# Altium footprint library Connectors.PcbLib: 42 footprints (part 3 of 3)
Each footprint in its own frame and in the unit in brackets; x right, y up, seen from the top. Pads: shape width x height; smd on the part's side, far side on the other; paste and mask are expansions set on the pad; w line width, h text height; cw(c..) or ccw(c..) is an arc to the next point about the centre after c.
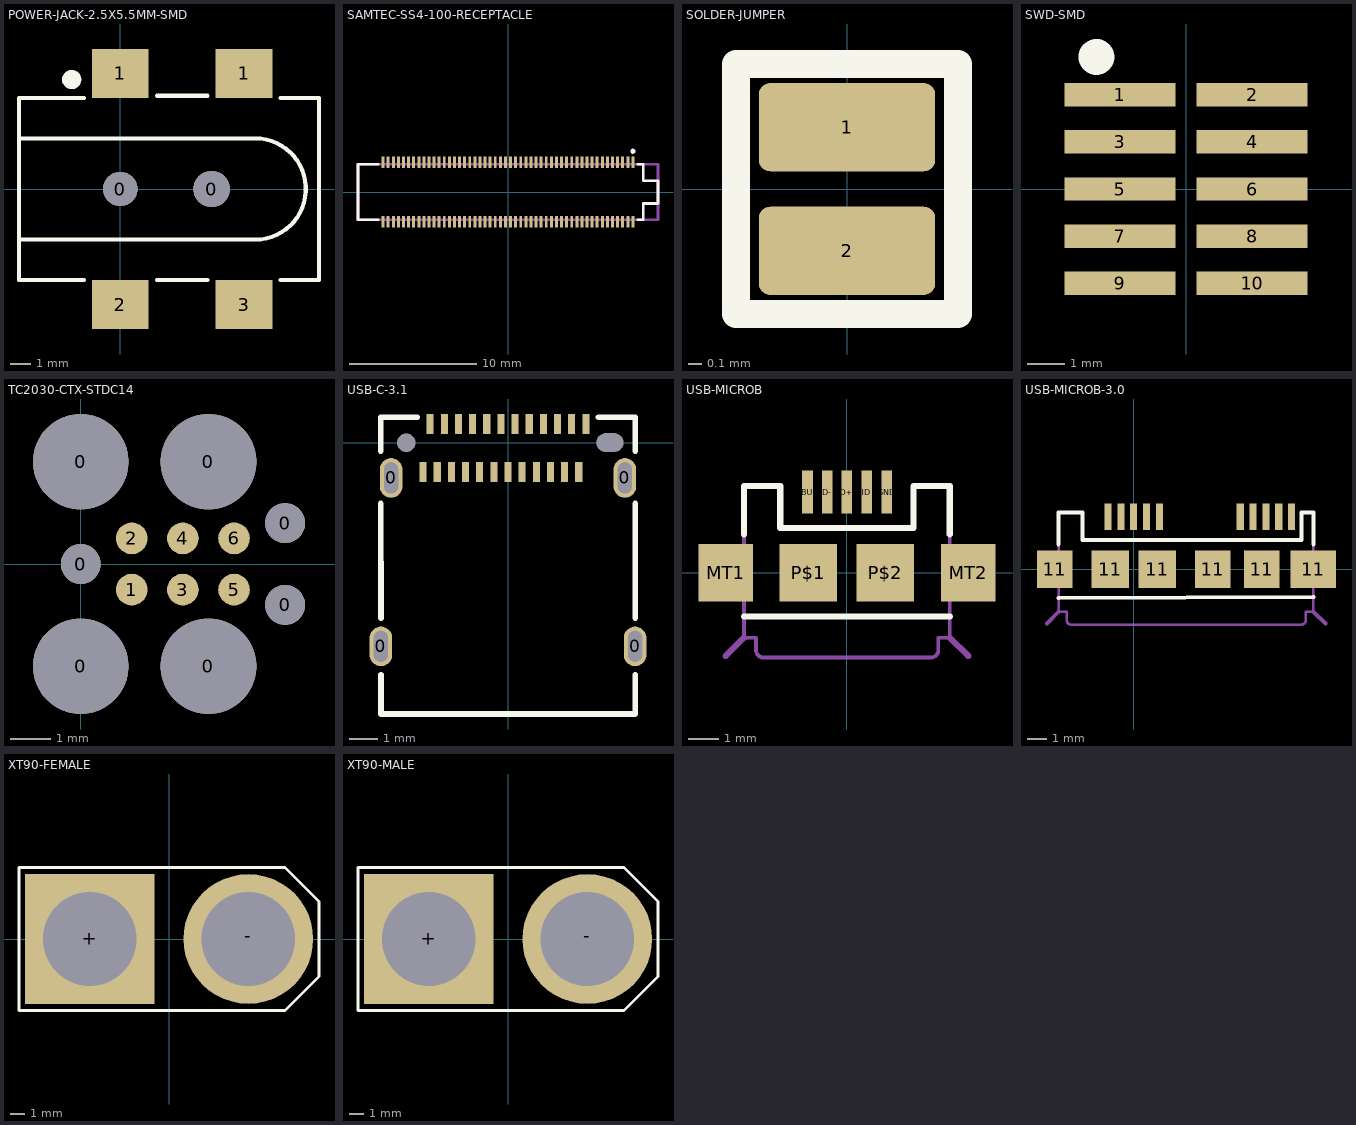
[diagram p2: the footprints below, top view; thin cyan lines are the x and y axes]

## POWER-JACK-2.5X5.5MM-SMD [mm]
pads (6):
  round 1.7 hole 1.7: 0(0,0)
  round 1.8 hole 1.8: 0(4.5,0)
  rect 2.8x2.4 smd: 1(0,5.7) 1(6.1,5.7) 2(0,-5.7) 3(6.1,-5.7)
Top Overlay:
  circle w0.5: c-2.4,5.4 r0.224
  lines w0.2: -5,-2.5 6.65,-2.5 ccw(c6.65,0) 6.65,2.5 -5,2.5 ; -1.8,-4.5 -5,-4.5 -5,4.5 -1.8,4.5 ; 1.8,-4.5 4.3,-4.5 ; 1.8,4.6 4.3,4.6 ; 7.9,-4.5 9.8,-4.5 9.8,4.5 7.9,4.5
3D body "CUI_PJ-002BH-SMT-TR.step": height 11.2, standoff -1, extent -5,-6.3 9.8,6.3

## SAMTEC-SS4-100-RECEPTACLE [mm]
pads (100):
  rect 0.23x0.93 smd: 1(9.8,2.335) 2(9.8,-2.335) 3(9.4,2.335) 4(9.4,-2.335) 5(9,2.335) 6(9,-2.335) 7(8.6,2.335) 8(8.6,-2.335) 9(8.2,2.335) 10(8.2,-2.335) 11(7.8,2.335) 12(7.8,-2.335) 13(7.4,2.335) 14(7.4,-2.335) 15(7,2.335) 16(7,-2.335) 17(6.6,2.335) 18(6.6,-2.335) 19(6.2,2.335) 20(6.2,-2.335) 21(5.8,2.335) 22(5.8,-2.335) 23(5.4,2.335) 24(5.4,-2.335) 25(5,2.335) 26(5,-2.335) 27(4.6,2.335) 28(4.6,-2.335) 29(4.2,2.335) 30(4.2,-2.335) 31(3.8,2.335) 32(3.8,-2.335) 33(3.4,2.335) 34(3.4,-2.335) 35(3,2.335) 36(3,-2.335) 37(2.6,2.335) 38(2.6,-2.335) 39(2.2,2.335) 40(2.2,-2.335) 41(1.8,2.335) 42(1.8,-2.335) 43(1.4,2.335) 44(1.4,-2.335) 45(1,2.335) 46(1,-2.335) 47(0.6,2.335) 48(0.6,-2.335) 49(0.2,2.335) 50(0.2,-2.335) 51(-0.2,2.335) 52(-0.2,-2.335) 53(-0.6,2.335) 54(-0.6,-2.335) 55(-1,2.335) 56(-1,-2.335) 57(-1.4,2.335) 58(-1.4,-2.335) 59(-1.8,2.335) 60(-1.8,-2.335) 61(-2.2,2.335) 62(-2.2,-2.335) 63(-2.6,2.335) 64(-2.6,-2.335) 65(-3,2.335) 66(-3,-2.335) 67(-3.4,2.335) 68(-3.4,-2.335) 69(-3.8,2.335) 70(-3.8,-2.335) 71(-4.2,2.335) 72(-4.2,-2.335) 73(-4.6,2.335) 74(-4.6,-2.335) 75(-5,2.335) 76(-5,-2.335) 77(-5.4,2.335) 78(-5.4,-2.335) 79(-5.8,2.335) 80(-5.8,-2.335) 81(-6.2,2.335) 82(-6.2,-2.335) 83(-6.6,2.335) 84(-6.6,-2.335) 85(-7,2.335) 86(-7,-2.335) 87(-7.4,2.335) 88(-7.4,-2.335) 89(-7.8,2.335) 90(-7.8,-2.335) 91(-8.2,2.335) 92(-8.2,-2.335) 93(-8.6,2.335) 94(-8.6,-2.335) 95(-9,2.335) 96(-9,-2.335) 97(-9.4,2.335) 98(-9.4,-2.335) 99(-9.8,2.335) 100(-9.8,-2.335)
Top Overlay:
  circle w0.25: c9.8,3.2 r0.076
  lines w0.2: -10.2,-2.185 -11.77,-2.185 -11.77,2.185 -10.2,2.185 ; 10.2,-2.185 10.615,-2.185 10.615,-0.9 11.77,-0.9 11.77,0.9 10.615,0.9 10.615,2.185 10.2,2.185
Mechanical 15:
  lines w0.2: -11.77,-2.185 11.77,-2.185 11.77,2.185 -11.77,2.185 -11.77,-2.185
3D body "SS4-50-3.00-L-D-K-TR.stp": height 3.38, standoff -0.12, extent -11.56,-2.5 11.98,2.5
3D body: height 0.25, standoff 0, extent 4.7,-7.5 4.7,-7.5

## SOLDER-JUMPER [mm]
pads (2):
  rrect25% 1.27x0.635 smd mask+0: 1(0,0.445) 2(0,-0.445)
Top Overlay:
  lines w0.203: -0.8,-0.9 0.8,-0.9 0.8,0.9 -0.8,0.9 -0.8,-0.9

## SWD-SMD [mm]
pads (10):
  rect 3x0.625 smd: 1(-1.778,2.54) 2(1.778,2.54) 3(-1.778,1.27) 4(1.778,1.27) 5(-1.778,0) 6(1.778,0) 7(-1.778,-1.27) 8(1.778,-1.27) 9(-1.778,-2.54) 10(1.778,-2.54)
Top Overlay:
  circle w0.762: c-2.413,3.556 r0.1
3D body "FTSH-105-01-F-DV.stp": height 5.96, standoff -0.01, extent -2.921,-3.175 2.921,3.175

## TC2030-CTX-STDC14 [mil]
pads (13):
  round 93.5 hole 93.5 unplated: 0(0,-100) 0(0,100) 0(125,-100) 0(125,100)
  round 39 hole 39 unplated: 0(0,0) 0(200,-40) 0(200,40)
  round 31 smd paste-31: 1(50,-25) 2(50,25) 3(100,-25) 4(100,25) 5(150,-25) 6(150,25)

## USB-C-3.1 [mm]
pads (30):
  oval 0.8x1.4 hole 0.5 slot 1.1 at 90 deg unplated: 0(-4.49,-7.2) 0(-4.13,-1.25) 0(4.13,-1.25) 0(4.49,-7.2)
  round 0 hole 0.65 unplated: 0(-3.6,0)
  round 0 hole 0.65 slot 0.95 at 0 deg unplated: 0(3.6,0)
  rect 0.25x0.7 smd: A1(-2.75,0.66) A2(-2.25,0.66) A3(-1.75,0.66) A4(-1.25,0.66) A5(-0.75,0.66) A6(-0.25,0.66) A7(0.25,0.66) A8(0.75,0.66) A9(1.25,0.66) A10(1.75,0.66) A11(2.25,0.66) A12(2.75,0.66) B1(2.5,-1.04) B2(2,-1.04) B3(1.5,-1.04) B4(1,-1.04) B5(0.5,-1.04) B6(0,-1.04) B7(-0.5,-1.04) B8(-1,-1.04) B9(-1.5,-1.04) B10(-2,-1.04) B11(-2.5,-1.04) B12(-3,-1.04)
Top Overlay:
  lines w0.2: -4.5,-2.15 -4.49,-6.2 ; -4.5,-0.3 -4.5,0.9 -3.21,0.9 ; -4.49,-8.2 -4.49,-9.59 4.49,-9.59 4.5,-9.58 4.5,-8.2 ; 3.2,0.9 4.5,0.9 4.5,-0.3 ; 4.5,-6.2 4.5,-2.15
3D body "M-12401610E4#2A-REVT2.stp": height 3.28, standoff -1.3, extent -4.6,-9.6 4.6,0.95

## USB-MICROB [mil]
pads (9):
  rect 14x56 smd: D+(0,105) D-(-25.59,105) GND(52,105) ID(26,105) VBUS(-51.18,105)
  rect 71x75 smd: MT1(-157.48,0) MT2(158,0)
  rect 75x75 smd: P$1(-50,0) P$2(50,0)
Top Overlay:
  lines w8: -133.86,-57.09 134,-57.09 ; -133.86,50 -133.86,113 -86.61,113 -86.61,58 87,58 87,113 134,113 134,50
Mechanical 16:
  lines w5: -133.86,-57.09 134,-57.09 ; -133.86,-57.09 -133.86,113 -86.61,113 -86.61,58 87,58 87,113 134,113 134,-57.09 ; -133.86,-57.09 -133.86,-84.65 -118.11,-84.65 -118.11,-100.39 ccw(c-108.76,-100.98) -110.24,-110.24 109,-110.24 ccw(c109.67,-100.8) 119,-102.36 119,-84.65 134,-84.65 134,-57.09
  lines w8: -157.48,-108.27 -133.86,-84.65 ; 134,-84.65 158,-108.27
3D body "micro USB.STEP": height 112.35, standoff -2.75, extent -156.96,-98.43 156.96,115.19

## USB-MICROB-3.0 [mm]
pads (16):
  rect 0.36x1.35 smd: 1(-1.3,2.667) 2(-0.65,2.667) 3(0,2.667) 4(0.65,2.667) 5(1.3,2.667) 6(5.4,2.667) 7(6.05,2.667) 8(6.7,2.667) 9(7.35,2.667) 10(8,2.667)
  rect 1.8x1.9 smd: 11(-4,0) 11(4,0) 11(6.5,0)
  rect 1.9x1.9 smd: 11(-1.2,0) 11(1.2,0)
  rect 2.3x1.9 smd: 11(9.1,0)
Top Overlay:
  lines w0.203: -3.8,-1.45 9.1,-1.4 ; -3.8,1.27 -3.8,2.87 -2.6,2.87 -2.6,1.473 8.5,1.473 8.5,2.87 9.104,2.87 9.104,1.27
Mechanical 16:
  lines w0.127: 1.81,1.473 -2.6,1.473 -2.6,2.87 -3.8,2.87 -3.8,-1.45 ; 3.004,-1.45 -3.8,-1.45 ; 8.469,-2.8 ccw(c8.486,-2.56) 8.723,-2.6 8.723,-2.15 9.104,-2.15 9.104,-1.45 9.104,2.87 8.5,2.87 8.5,1.473 ; 8.5,-2.8 -3.2,-2.8 cw(c-3.162,-2.565) -3.4,-2.55 -3.4,-2.15 -3.8,-2.15 -3.8,-1.45
  lines w0.203: -4.4,-2.75 -3.8,-2.15 ; 9.104,-2.15 9.713,-2.75
3D body "uj3-miabh-1-smt.stp": height 2.75, standoff -0.27, extent -4.425,-2.809 9.725,2.9

## XT90-FEMALE [mm]
pads (2):
  rect 9x9 hole 6.5: +(-5.5,0)
  round 9 hole 6.5: -(5.5,0)
Top Overlay:
  lines w0.2: -10.4,-4.95 8.05,-4.95 10.4,-2.6 10.4,2.6 8.05,4.95 -10.4,4.95 -10.4,-4.95
3D body "CONNECTOR_XT-90_FEMALE_.STEP": height 21.4, standoff -4.93, extent -10.51,-5.47 10.51,5.47

## XT90-MALE [mm]
pads (2):
  rect 9x9 hole 6.5: +(-5.5,0)
  round 9 hole 6.5: -(5.5,0)
Top Overlay:
  lines w0.2: -10.4,-4.95 8.05,-4.95 10.4,-2.6 10.4,2.6 8.05,4.95 -10.4,4.95 -10.4,-4.95
3D body "xt90_male_asm.stp": height 20.7, standoff -5.5, extent -10.7,-5.5 10.7,5.5